# Altium integrated library Cap-General-SMD_V2.IntLib: 11 symbols
Pins are listed as number, name and electrical type; pins without a type are passive.

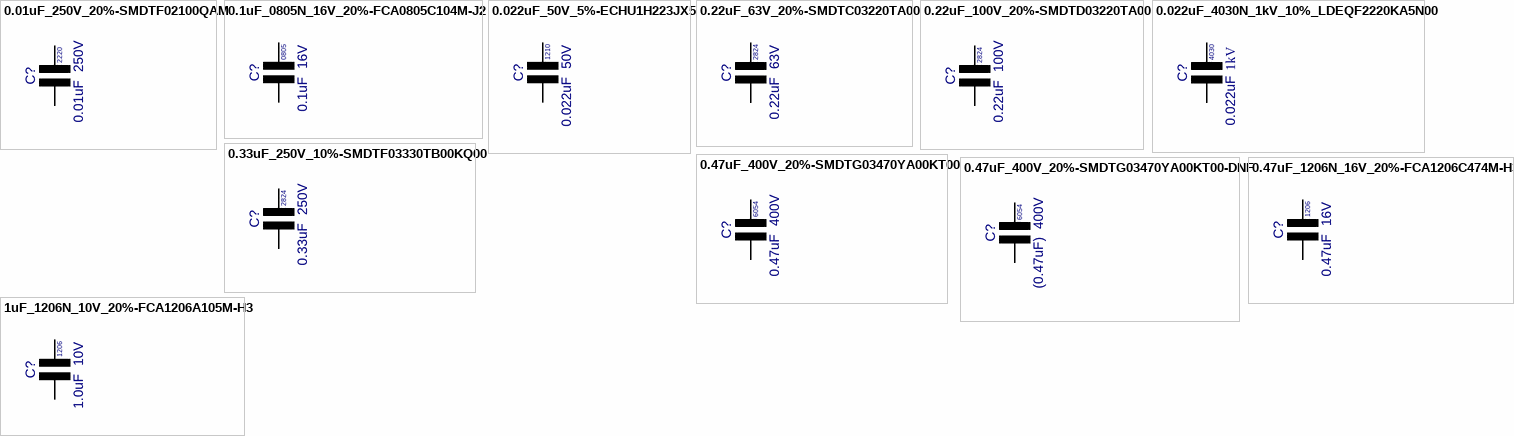
[diagram p0: symbols 0.01uF_250V_20%-SMDTF02100QAM to 1uF_1206N_10V_20%-FCA1206A105M-H3]

## 0.01uF_250V_20%-SMDTF02100QAM
designator C?, comment value 0.01uF  Voltage: 250V  Text1: 2220  (hidden comment: SMDTF02100QAM)
Cap Film SMD-PET; Manufacturer: Wima; Tol: 20%; Part Number: SMDTF02100QAM; Package: C2220-350; EDM-PN: *; Text2: *
footprint CAPC2220x350 (Chip Capacitor, 1825, 2-Leads, Body 5.6x5.0mm)
pins: 1, 2

## 0.1uF_0805N_16V_20%-FCA0805C104M-J2
designator C?, comment value 0.1uF  Voltage: 16V  Text1: 0805  (hidden comment: FCA0805C104M-J2)
Cap Film Acrylic Metallized; Manufacturer: CDE; EDM-PN: CAP1304; Tol: 20%; Reutech PN: 5910-CA-; Part Number: FCA0805C104M-J2; Package: CAPC0805X110N; Text2: *; SAAB PN: *
footprint CAPC0805X110N (Chip Capacitor, 0805, 2-Leads, Body 2.0x1.3mm, IPC Medium Density)
pins: 1, 2

## 0.022uF_50V_5%-ECHU1H223JX5
designator C?, comment value 0.022uF  Voltage: 50V  Text1: 1210  (hidden comment: ECHU1H223JX5)
Cap Polyphenylene Sulphide (PPS); Manufacturer: Panasonic; Tol: 5%; Part Number: ECHU1H223JX5; Package: CAPC1210X180N; EDM-PN: *; Text2: *
footprint CAPC1210X180N (Chip Capacitor, 1210, 2-Leads, Body 3.2x2.5mm, IPC Medium Density)
pins: 1, 2

## 0.22uF_63V_20%-SMDTC03220TA00
designator C?, comment value 0.22uF  Voltage: 63V  Text1: 2824  (hidden comment: SMDTC03220TA00)
Cap Film Metallized Polyester (PET); Manufacturer: Wima; Tol: 20%; Part Number: SMDTC03220TA00; Package: CAPC2824-3-WIMA; EDM-PN: *; Text2: *
footprint CAPC2824-3-WIMA (Chip Capacitor, 2824, 2-Leads, Body 7.2x6.1mm)
pins: 1, 2

## 0.22uF_100V_20%-SMDTD03220TA00
designator C?, comment value 0.22uF  Voltage: 100V  Text1: 2824  (hidden comment: SMDTD03220TA00)
Cap Film Metallized Polyester (PET); Manufacturer: Wima; Tol: 20%; Part Number: SMDTD03220TA00; Package: CAPC2824-3-WIMA; EDM-PN: *; Text2: *
footprint CAPC2824-3-WIMA (Chip Capacitor, 2824, 2-Leads, Body 7.2x6.1mm)
pins: 1, 2

## 0.022uF_4030N_1kV_10%_LDEQF2220KA5N00
designator C?, comment value 0.022uF  Voltage: 1kV  Text1: 4030  (hidden comment: LDEQF2220KA5N00)
Cap PEN Unencapsulated Stacked Chip; Manufacturer: Kemet; Tol: 10%; Reutech PN: 5910-CA-; Part Number: LDEQF2220KA5N00; Package: CAPC4030x340; EDM-PN: *; Text2: *
footprint CAPC4030x340 (Chip Capacitor, 3040, 2-Leads, Body 10.5x7.9mm)
pins: 1, 2

## 0.33uF_250V_10%-SMDTF03330TB00KQ00
designator C?, comment value 0.33uF  Voltage: 250V  Text1: 2824  (hidden comment: SMDTF03330TB00KQ00)
Cap Film Metallized Polyester (PET) 250VDC/160VAC; Manufacturer: Wima; Tol: 10%; Part Number: SMDTF03330TB00KQ00; Package: CAPC2824-3-WIMA; EDM-PN: *; Text2: *
footprint CAPC2824-3-WIMA (Chip Capacitor, 2824, 2-Leads, Body 7.2x6.1mm)
pins: 1, 2

## 0.47uF_400V_20%-SMDTG03470YA00KT00
designator C?, comment value 0.47uF  Voltage: 400V  Text1: 6054  (hidden comment: SMDTG03470YA00KT00)
Cap Film Metallized Polyester (PET); Manufacturer: Wima; Tol: 20%; Part Number: SMDTG03470YA00KT00; Package: CAPC6054X700N; EDM-PN: *; Text2: *
footprint CAPC6054X700N (Capacitor 6054 15.3x13.7mm)
pins: 1, 2

## 0.47uF_400V_20%-SMDTG03470YA00KT00-DNF
designator C?, comment value (0.47uF)  Voltage: 400V  Text1: 6054  (hidden comment: SMDTG03470YA00KT00)
Cap Film Metallized Polyester (PET) - Do not Fit; Manufacturer: Wima; Part Number: DNF - SMDTG03470YA00KT00; Tol: 20%; Package: CAPC6054X700N; EDM-PN: *; Text2: *
footprint CAPC6054X700N (Capacitor 6054 15.3x13.7mm)
pins: 1, 2

## 0.47uF_1206N_16V_20%-FCA1206C474M-H3
designator C?, comment value 0.47uF  Voltage: 16V  Text1: 1206  (hidden comment: FCA1206C474M-H3)
Cap Film Acrylic Metallized; Manufacturer: CDE; EDM-PN: CAP1382; Tol: 20%; Part Number: FCA1206C474M-H3; Package: CAPC1206X135N; Text2: *
footprint CAPC1206X135N (Chip Capacitor, 1206, 2-Leads, Body 3.2x1.6mm, IPC Medium Density)
pins: 1, 2

## 1uF_1206N_10V_20%-FCA1206A105M-H3
designator C?, comment value 1.0uF  Voltage: 10V  Text1: 1206  (hidden comment: FCA1206A105M-H3)
Cap Film Acrylic Metallized; Manufacturer: CDE; Tol: 20%; Part Number: FCA1206A105M-H3; Package: CAPC1206X135N; EDM-PN: *; Text2: *
footprint CAPC1206X135N (Chip Capacitor, 1206, 2-Leads, Body 3.2x1.6mm, IPC Medium Density)
pins: 1, 2